# Altium footprint library LEMO THD_OLD.PcbLib: 54 footprints (part 3 of 4) (continued)
## LEMO_EZG.0B.302.CLN [mm] "Size 0B, Straight Receptacle with 2 Female Contacts and Alignment Key (G)"
height 15
pads (6):
  round 1.6 hole 0.9: 1(0,1.1) 2(0,-1.1)
  round 3.5 hole 1.8: 3(-3.81,-3.81) 3(-3.81,3.81) 3(3.81,-3.81) 3(3.81,3.81)
Top Overlay:
  lines w0.2: -5,-2.08 -5,2.08 ; -4.151,-1.738 cw(c0,0) -4.151,1.738 ; -3.239,-1.789 cw(c0,0) -3.239,1.789 ; -2.08,-5 2.08,-5 ; -2.08,5 2.08,5 ; -1.789,-3.239 ccw(c0,0) 1.789,-3.239 ; -1.789,3.239 cw(c0,0) -0.5,3.666 -0.5,4.05 0.5,4.05 0.5,3.666 cw(c0,0) 1.789,3.239 ; -1.738,-4.151 ccw(c0,0) 1.738,-4.151 ; -1.738,4.151 cw(c0,0) 1.738,4.151 ; -0.883,2.069 ccw(c0,0) -0.827,-2.093 ; 0.823,2.094 cw(c0,0) 1.103,-1.961 ; 3.239,-1.789 ccw(c0,0) 3.239,1.789 ; 4.151,-1.738 ccw(c0,0) 4.151,1.738 ; 5,-2.08 5,2.08
  text "1" at -0.162,2.293 h1
  text "2" at -0.299,-3.308 h1
Mechanical 8:
  lines w0.1: -4.31,-3.81 -3.81,-3.81 ; -4.31,3.81 -3.81,3.81 ; -3.81,-4.31 -3.81,-3.81 ; -3.81,-3.31 -3.81,-3.81 ; -3.81,3.31 -3.81,3.81 ; -3.81,4.31 -3.81,3.81 ; -3.31,-3.81 -3.81,-3.81 ; -3.31,3.81 -3.81,3.81 ; -0.5,-1.1 0,-1.1 ; -0.5,0 0,0 ; -0.5,1.1 0,1.1 ; 0,-1.6 0,-1.1 ; 0,-0.6 0,-1.1 ; 0,-0.5 0,0 ; 0,0.5 0,0 ; 0,0.6 0,1.1 ; 0,1.6 0,1.1 ; 0.5,-1.1 0,-1.1 ; 0.5,0 0,0 ; 0.5,1.1 0,1.1 ; 3.31,-3.81 3.81,-3.81 ; 3.31,3.81 3.81,3.81 ; 3.81,-4.31 3.81,-3.81 ; 3.81,-3.31 3.81,-3.81 ; 3.81,3.31 3.81,3.81 ; 3.81,4.31 3.81,3.81 ; 4.31,-3.81 3.81,-3.81 ; 4.31,3.81 3.81,3.81
Mechanical 14:
  circle w0.1: c0,1.1 r0.35
  circle w0.1: c0,-1.1 r0.35
  circle w0.1: c0,1.1 r0.55
  circle w0.1: c0,-1.1 r0.55
  circle w0.1: c0,0 r2.25
  circle w0.1: c0,0 r4.5
  lines w0.1: -5,-2.527 ccw(c-3.81,-3.81) -2.527,-5 ; -5,2.527 cw(c-3.81,3.81) -2.527,5 ; 2.527,-5 ccw(c3.81,-3.81) 5,-2.527 ; 2.527,5 cw(c3.81,3.81) 5,2.527 ; -5,-4.346 -5,4.346 -4.346,5 4.346,5 5,4.346 5,-4.346 4.346,-5 -4.346,-5 -5,-4.346 ; -0.5,3.666 ccw(c0,0) 0.5,3.666 0.5,4.05 -0.5,4.05 -0.5,3.666
  text "1" at -0.162,2.293 h1
  text "2" at -0.299,-3.308 h1
3D body "LEMO_EZG.0B.302.CLN_Part1.stp": height 15, standoff -4.5, extent -5,-5 5,5
3D body "LEMO_EZG.0B.302.CLN_Part2.stp": height 3.9, standoff -3.7, extent -5.56,-5.56 5.56,5.56

## LEMO_EZG.0S.302.NLNY [mm] "Serie 0S, 1 Female + 1 Male Contacts, Straight Socket With Key (G)"
height 15.8
pads (6):
  round 1.6 hole 0.9: 1(0,1.1) 2(0,-1.1) 3(-3.81,-3.81) 3(-3.81,3.81) 3(3.81,-3.81) 3(3.81,3.81)
Top Overlay:
  circle w0.2: c0,0 r4.1
  lines w0.2: -3.573,-2.736 cw(c0,0) -3.573,2.736 ; -2.736,-3.573 ccw(c0,0) 2.736,-3.573 ; -2.736,3.573 cw(c0,0) 2.736,3.573 ; 3.573,-2.736 ccw(c0,0) 3.573,2.736 ; -5,-4.293 -4.293,-5 4.293,-5 5,-4.293 5,4.293 4.293,5 -4.293,5 -5,4.293 -5,-4.293 ; -2.25,0 cw(c0,0) 2.25,0 -2.25,0 ; -0.6,3.551 ccw(c0,-0.1) 0.6,3.551 0.6,3.9 -0.6,3.9 -0.6,3.551
  text "2" at 1.326,-1.598 h1
  text "1" at 2.764,0.091 h1
Mechanical 8:
  circle w0.1: c-3.81,3.81 r1.2
  circle w0.1: c3.81,3.81 r1.2
  circle w0.1: c3.81,-3.81 r1.2
  circle w0.1: c-3.81,-3.81 r1.2
  lines w0.1: -4.31,-3.81 -3.81,-3.81 ; -4.31,3.81 -3.81,3.81 ; -3.81,-4.31 -3.81,-3.81 ; -3.81,-3.31 -3.81,-3.81 ; -3.81,3.31 -3.81,3.81 ; -3.81,4.31 -3.81,3.81 ; -3.31,-3.81 -3.81,-3.81 ; -3.31,3.81 -3.81,3.81 ; -0.5,-1.1 0,-1.1 ; -0.5,0 0,0 ; -0.5,1.1 0,1.1 ; 0,-1.6 0,-1.1 ; 0,-0.6 0,-1.1 ; 0,-0.5 0,0 ; 0,0.5 0,0 ; 0,0.6 0,1.1 ; 0,1.6 0,1.1 ; 0.5,-1.1 0,-1.1 ; 0.5,0 0,0 ; 0.5,1.1 0,1.1 ; 3.31,-3.81 3.81,-3.81 ; 3.31,3.81 3.81,3.81 ; 3.81,-4.31 3.81,-3.81 ; 3.81,-3.31 3.81,-3.81 ; 3.81,3.31 3.81,3.81 ; 3.81,4.31 3.81,3.81 ; 4.31,-3.81 3.81,-3.81 ; 4.31,3.81 3.81,3.81
Mechanical 14:
  circle w0.1: c0,0 r4.5
  circle w0.1: c0,0 r4.1
  circle w0.1: c0,1.1 r0.55
  circle w0.1: c0,-1.1 r0.5
  lines w0.1: -0.5,-1.1 0.5,-1.1 ; -0.49,-1.2 0.49,-1.2 ; -0.49,-1 0.49,-1 ; -0.458,-1.3 0.458,-1.3 ; -0.458,-0.9 0.458,-0.9 ; -0.4,-1.4 0.4,-1.4 ; -0.4,-0.8 0.4,-0.8 ; -0.3,-1.5 0.3,-1.5 ; -0.3,-0.7 0.3,-0.7 ; -5,-4.293 -4.293,-5 4.293,-5 5,-4.293 5,4.293 4.293,5 -4.293,5 -5,4.293 -5,-4.293 ; -2.25,0 cw(c0,0) 2.25,0 -2.25,0 ; -0.6,3.551 ccw(c0,-0.1) 0.6,3.551 0.6,3.9 -0.6,3.9 -0.6,3.551
  text "2" at 1.326,-1.598 h1
  text "1" at 2.764,0.091 h1
3D body "LEMO_EZG.0S.302.NLNY.stp": height 15.8, standoff -4, extent -5.01,-5.004 5.004,5.002

## LEMO_EZG.1B.302.CLN [mm] "Size 1B, Straight Socket with 2 Female Contacts and Alignment Key (G)"
height 19
pads (6):
  round 1.6 hole 0.9: 1(0,1.4) 2(0,-1.4)
  round 2.5 / inner round 2.5 / far side round 3.7 hole 1.8: 3(-3.81,-3.81) 3(-3.81,3.81) 3(3.81,-3.81) 3(3.81,3.81)
Top Layer:
  region: -2.55,-2.55 -6.2,-2.55 -6.2,-5.374 -5.374,-6.2 -2.55,-6.2
  region: 2.55,-2.55 2.55,-6.2 5.374,-6.2 6.2,-5.374 6.2,-2.55
  region: 2.55,2.55 6.2,2.55 6.2,5.374 5.374,6.2 2.55,6.2
  region: -2.55,2.55 -2.55,6.2 -5.374,6.2 -6.2,5.374 -6.2,2.55
Top Overlay:
  lines w0.2: -6,-2.2 -6,2.2 ; -5.147,-1.939 cw(c0,0) -5.147,1.939 ; -4.422,-1.593 cw(c0,0) -4.422,1.593 ; -2.2,-6 2.2,-6 ; -2.2,6 2.2,6 ; -1.939,-5.147 ccw(c0,0) 1.939,-5.147 ; -1.939,5.147 cw(c0,0) 1.939,5.147 ; -1.593,-4.422 ccw(c0,0) 1.593,-4.422 ; -1.593,4.422 cw(c0,0) -0.6,4.662 -0.6,5.065 cw(c0,0) 0.6,5.065 0.6,4.662 cw(c0,0) 1.593,4.422 ; 4.422,-1.593 ccw(c0,0) 4.422,1.593 ; 5.147,-1.939 ccw(c0,0) 5.147,1.939 ; 6,-2.2 6,2.2 6,-2.2
  text "2" at -0.318,-3.786 h1
  text "1" at -0.159,2.722 h1
Mechanical 8:
  circle w0.05: c-3.81,-3.81 r0.45
  circle w0.05: c-3.81,-3.81 r0.8
  circle w0.05: c3.81,-3.81 r0.45
  circle w0.05: c3.81,-3.81 r0.8
  circle w0.05: c3.81,3.81 r0.45
  circle w0.05: c3.81,3.81 r0.8
  circle w0.05: c-3.81,3.81 r0.45
  circle w0.05: c-3.81,3.81 r0.8
  circle w0.05: c-3.81,-3.81 r1.75
  circle w0.05: c3.81,-3.81 r1.75
  circle w0.05: c3.81,3.81 r1.75
  circle w0.05: c-3.81,3.81 r1.75
  lines w0.05: -4.729,-4.729 -4.375,-4.375 ; -4.729,-4.021 -4.375,-4.375 ; -4.729,4.021 -4.375,4.375 ; -4.729,4.729 -4.375,4.375 ; -4.31,-3.81 -3.81,-3.81 ; -4.31,3.81 -3.81,3.81 ; -4.021,-4.729 -4.375,-4.375 ; -4.021,-4.021 -4.375,-4.375 ; -4.021,4.021 -4.375,4.375 ; -4.021,4.729 -4.375,4.375 ; -3.81,-4.31 -3.81,-3.81 ; -3.81,-3.31 -3.81,-3.81 ; -3.81,3.31 -3.81,3.81 ; -3.81,4.31 -3.81,3.81 ; -3.31,-3.81 -3.81,-3.81 ; -3.31,3.81 -3.81,3.81 ; -0.5,-1.4 0,-1.4 ; -0.5,0 0,0 ; -0.5,1.4 0,1.4 ; 0,-1.9 0,-1.4 ; 0,-0.9 0,-1.4 ; 0,-0.5 0,0 ; 0,0.5 0,0 ; 0,0.9 0,1.4 ; 0,1.9 0,1.4 ; 0.5,-1.4 0,-1.4 ; 0.5,0 0,0 ; 0.5,1.4 0,1.4 ; 3.31,-3.81 3.81,-3.81 ; 3.31,3.81 3.81,3.81 ; 3.81,-4.31 3.81,-3.81 ; 3.81,-3.31 3.81,-3.81 ; 3.81,3.31 3.81,3.81 ; 3.81,4.31 3.81,3.81 ; 4.021,-4.729 4.375,-4.375 ; 4.021,-4.021 4.375,-4.375 ; 4.021,4.021 4.375,4.375 ; 4.021,4.729 4.375,4.375 ; 4.31,-3.81 3.81,-3.81 ; 4.31,3.81 3.81,3.81 ; 4.729,-4.729 4.375,-4.375 ; 4.729,-4.021 4.375,-4.375 ; 4.729,4.021 4.375,4.375 ; 4.729,4.729 4.375,4.375 ; -6.2,-5.374 -6.2,-2.55 -2.55,-2.55 -2.55,-6.2 -5.374,-6.2 -6.2,-5.374 ; -6.2,2.55 -6.2,5.374 -5.374,6.2 -2.55,6.2 -2.55,2.55 -6.2,2.55 ; -6,-5.292 -6,-2.75 -2.75,-2.75 -2.75,-6 -5.292,-6 -6,-5.292 ; -6,2.75 -6,5.292 -5.292,6 -2.75,6 -2.75,2.75 -6,2.75 ; 2.55,-6.2 5.374,-6.2 6.2,-5.374 6.2,-2.55 2.55,-2.55 2.55,-6.2 ; 2.55,2.55 6.2,2.55 6.2,5.374 5.374,6.2 2.55,6.2 2.55,2.55 ; 2.75,-6 5.292,-6 6,-5.292 6,-2.75 2.75,-2.75 2.75,-6 ; 2.75,2.75 6,2.75 6,5.292 5.292,6 2.75,6 2.75,2.75
Mechanical 14:
  circle w0.1: c0,-1.4 r0.5
  circle w0.1: c0,0 r5.5
  circle w0.1: c0,1.4 r0.5
  circle w0.1: c0,0 r3
  lines w0.1: 6,-5.292 6,5.292 ; 6,-5.292 5.292,-6 -5.292,-6 -6,-5.292 -6,5.292 -5.292,6 5.292,6 6,5.292 ; 6,-5.292 6,5.292 ; -0.6,4.662 ccw(c0,0) 0.6,4.662 0.6,5.065 ccw(c0,0) -0.6,5.065 -0.6,4.662
  text "2" at -0.318,-3.786 h1
  text "1" at -0.159,2.722 h1
3D body "LEMO_EZG.1B.304.NLN_Part2.stp": height 3.9, standoff -3.2, extent -5.56,-5.56 5.56,5.56
3D body "LEMO_EZG.1B.302.CLN.stp": height 19, standoff -3.8, extent -6,-6 6,6

## LEMO_EZG.1B.304.NLN [mm] "Size 1B, Straight Socket with 4 Female Contacts and Alignment Key (G)"
height 19
pads (8):
  round 1.6 hole 0.9: 1(-1.096,1.096) 2(-1.096,-1.096) 3(1.096,-1.096) 4(1.096,1.096)
  round 2.5 / inner round 2.5 / far side round 3.7 hole 1.8: 5(-3.81,-3.81) 5(-3.81,3.81) 5(3.81,-3.81) 5(3.81,3.81)
Top Layer:
  region: -2.55,2.55 -2.55,6.2 -5.374,6.2 -6.2,5.374 -6.2,2.55
  region: 2.55,2.55 6.2,2.55 6.2,5.374 5.374,6.2 2.55,6.2
  region: 2.55,-2.55 2.55,-6.2 5.374,-6.2 6.2,-5.374 6.2,-2.55
  region: -2.55,-2.55 -6.2,-2.55 -6.2,-5.374 -5.374,-6.2 -2.55,-6.2
Top Overlay:
  lines w0.2: -6,-2.2 -6,2.2 ; -5.147,-1.939 cw(c0,0) -5.147,1.939 ; -4.422,-1.593 cw(c0,0) -4.422,1.593 ; -2.2,-6 2.2,-6 ; -2.2,6 2.2,6 ; -1.939,-5.147 ccw(c0,0) 1.939,-5.147 ; -1.939,5.147 cw(c0,0) 1.939,5.147 ; -1.593,-4.422 ccw(c0,0) 1.593,-4.422 ; -1.593,4.422 cw(c0,0) -0.6,4.662 -0.6,5.065 cw(c0,0) 0.6,5.065 0.6,4.662 cw(c0,0) 1.593,4.422 ; 4.422,-1.593 ccw(c0,0) 4.422,1.593 ; 5.147,-1.939 ccw(c0,0) 5.147,1.939 ; 6,-2.2 6,2.2 6,-2.2
  text "1" at -3.81,0.5 h1
  text "2" at -3.969,-1.429 h1
  text "3" at 3.493,-1.429 h1
  text "4" at 3.493,0.5 h1
Mechanical 8:
  circle w0.05: c-3.81,3.81 r1.75
  circle w0.05: c3.81,3.81 r1.75
  circle w0.05: c3.81,-3.81 r1.75
  circle w0.05: c-3.81,-3.81 r1.75
  circle w0.05: c-3.81,3.81 r0.8
  circle w0.05: c-3.81,3.81 r0.45
  circle w0.05: c3.81,3.81 r0.8
  circle w0.05: c3.81,3.81 r0.45
  circle w0.05: c3.81,-3.81 r0.8
  circle w0.05: c3.81,-3.81 r0.45
  circle w0.05: c-3.81,-3.81 r0.8
  circle w0.05: c-3.81,-3.81 r0.45
  lines w0.05: -4.729,-4.729 -4.375,-4.375 ; -4.729,-4.021 -4.375,-4.375 ; -4.729,4.021 -4.375,4.375 ; -4.729,4.729 -4.375,4.375 ; -4.31,-3.81 -3.81,-3.81 ; -4.31,3.81 -3.81,3.81 ; -4.021,-4.729 -4.375,-4.375 ; -4.021,-4.021 -4.375,-4.375 ; -4.021,4.021 -4.375,4.375 ; -4.021,4.729 -4.375,4.375 ; -3.81,-4.31 -3.81,-3.81 ; -3.81,-3.31 -3.81,-3.81 ; -3.81,3.31 -3.81,3.81 ; -3.81,4.31 -3.81,3.81 ; -3.31,-3.81 -3.81,-3.81 ; -3.31,3.81 -3.81,3.81 ; -1.596,-1.096 -1.096,-1.096 ; -1.596,1.096 -1.096,1.096 ; -1.096,-1.596 -1.096,-1.096 ; -1.096,-0.596 -1.096,-1.096 ; -1.096,0.596 -1.096,1.096 ; -1.096,1.596 -1.096,1.096 ; -0.596,-1.096 -1.096,-1.096 ; -0.596,1.096 -1.096,1.096 ; -0.5,0 0,0 ; 0,-0.5 0,0 ; 0,0.5 0,0 ; 0.5,0 0,0 ; 0.596,-1.096 1.096,-1.096 ; 0.596,1.096 1.096,1.096 ; 1.096,-1.596 1.096,-1.096 ; 1.096,-0.596 1.096,-1.096 ; 1.096,0.596 1.096,1.096 ; 1.096,1.596 1.096,1.096 ; 1.596,-1.096 1.096,-1.096 ; 1.596,1.096 1.096,1.096 ; 3.31,-3.81 3.81,-3.81 ; 3.31,3.81 3.81,3.81 ; 3.81,-4.31 3.81,-3.81 ; 3.81,-3.31 3.81,-3.81 ; 3.81,3.31 3.81,3.81 ; 3.81,4.31 3.81,3.81 ; 4.021,-4.729 4.375,-4.375 ; 4.021,-4.021 4.375,-4.375 ; 4.021,4.021 4.375,4.375 ; 4.021,4.729 4.375,4.375 ; 4.31,-3.81 3.81,-3.81 ; 4.31,3.81 3.81,3.81 ; 4.729,-4.729 4.375,-4.375 ; 4.729,-4.021 4.375,-4.375 ; 4.729,4.021 4.375,4.375 ; 4.729,4.729 4.375,4.375 ; -6.2,-5.374 -5.374,-6.2 -2.55,-6.2 -2.55,-2.55 -6.2,-2.55 -6.2,-5.374 ; -6.2,2.55 -2.55,2.55 -2.55,6.2 -5.374,6.2 -6.2,5.374 -6.2,2.55 ; -6,-5.292 -5.292,-6 -2.75,-6 -2.75,-2.75 -6,-2.75 -6,-5.292 ; -6,2.75 -2.75,2.75 -2.75,6 -5.292,6 -6,5.292 -6,2.75 ; 2.55,-6.2 2.55,-2.55 6.2,-2.55 6.2,-5.374 5.374,-6.2 2.55,-6.2 ; 2.55,2.55 2.55,6.2 5.374,6.2 6.2,5.374 6.2,2.55 2.55,2.55 ; 2.75,-6 2.75,-2.75 6,-2.75 6,-5.292 5.292,-6 2.75,-6 ; 2.75,2.75 2.75,6 5.292,6 6,5.292 6,2.75 2.75,2.75
Mechanical 14:
  circle w0.1: c0,0 r3
  circle w0.1: c-1.096,1.096 r0.5
  circle w0.1: c0,0 r5.5
  circle w0.1: c-1.096,-1.096 r0.5
  circle w0.1: c1.096,-1.096 r0.5
  circle w0.1: c1.096,1.096 r0.5
  lines w0.1: 6,-5.292 6,5.292 ; 6,-5.292 5.292,-6 -5.292,-6 -6,-5.292 -6,5.292 -5.292,6 5.292,6 6,5.292 ; 6,-5.292 6,5.292 ; -0.6,4.662 ccw(c0,0) 0.6,4.662 0.6,5.065 ccw(c0,0) -0.6,5.065 -0.6,4.662
  text "1" at -3.81,0.5 h1
  text "2" at -3.969,-1.429 h1
  text "3" at 3.493,-1.429 h1
  text "4" at 3.492,0.5 h1
3D body "LEMO_EZG.1B.304.NLN_Part1.stp": height 19, standoff -3.8, extent -6,-6 6,6
3D body "LEMO_EZG.1B.304.NLN_Part2.stp": height 3.9, standoff -3.2, extent -5.56,-5.56 5.56,5.56

## LEMO_EZG.1B.306.CLN [mm] "Size 1B, Straight Socket with 6 Female Contacts and Alignment Key (G)"
height 19
pads (10):
  round 1.5 hole 0.9: 1(-0.925,1.602) 2(-1.85,0) 3(-0.925,-1.602) 4(0.925,-1.602) 5(1.85,0) 6(0.925,1.602)
  round 2.4 / inner round 2.4 / far side round 3.7 hole 1.8: 7(-3.81,-3.81) 7(-3.81,3.81) 7(3.81,-3.81) 7(3.81,3.81)
Top Layer:
  region: -2.55,2.55 -2.55,6.2 -5.374,6.2 -6.2,5.374 -6.2,2.55
  region: 2.55,2.55 6.2,2.55 6.2,5.374 5.374,6.2 2.55,6.2
  region: 2.55,-2.55 2.55,-6.2 5.374,-6.2 6.2,-5.374 6.2,-2.55
  region: -2.55,-2.55 -6.2,-2.55 -6.2,-5.374 -5.374,-6.2 -2.55,-6.2
Top Overlay:
  lines w0.2: -6,-2.2 -6,2.2 ; -5.147,-1.939 cw(c0,0) -5.147,1.939 ; -4.422,-1.593 cw(c0,0) -4.422,1.593 ; -2.2,-6 2.2,-6 ; -2.2,6 2.2,6 ; -1.939,-5.147 ccw(c0,0) 1.939,-5.147 ; -1.939,5.147 cw(c0,0) 1.939,5.147 ; -1.593,-4.422 ccw(c0,0) 1.593,-4.422 ; -1.593,4.422 cw(c0,0) -0.6,4.662 -0.6,5.065 cw(c0,0) 0.6,5.065 0.6,4.662 cw(c0,0) 1.593,4.422 ; 4.422,-1.593 ccw(c0,0) 4.422,1.593 ; 5.147,-1.939 ccw(c0,0) 5.147,1.939 ; 6,-2.2 6,2.2 6,-2.2
  text "1" at -1.212,2.933 h1.2
  text "2" at -4.012,-0.642 h1.2
  text "5" at 3.238,-0.492 h1.2
  text "3" at -0.862,-4.092 h1.2
Mechanical 8:
  circle w0.1: c-3.81,-3.81 r0.45
  circle w0.1: c-3.81,-3.81 r0.8
  circle w0.1: c3.81,-3.81 r0.45
  circle w0.1: c3.81,-3.81 r0.8
  circle w0.1: c3.81,3.81 r0.45
  circle w0.1: c3.81,3.81 r0.8
  circle w0.1: c-3.81,3.81 r0.45
  circle w0.1: c-3.81,3.81 r0.8
  circle w0.1: c-3.81,-3.81 r1.75
  circle w0.1: c3.81,-3.81 r1.75
  circle w0.1: c3.81,3.81 r1.75
  circle w0.1: c-3.81,3.81 r1.75
  lines w0.1: -4.729,-4.729 -4.375,-4.375 ; -4.729,-4.021 -4.375,-4.375 ; -4.729,4.021 -4.375,4.375 ; -4.729,4.729 -4.375,4.375 ; -4.31,-3.81 -3.81,-3.81 ; -4.31,3.81 -3.81,3.81 ; -4.021,-4.729 -4.375,-4.375 ; -4.021,-4.021 -4.375,-4.375 ; -4.021,4.021 -4.375,4.375 ; -4.021,4.729 -4.375,4.375 ; -3.81,-4.31 -3.81,-3.81 ; -3.81,-3.31 -3.81,-3.81 ; -3.81,3.31 -3.81,3.81 ; -3.81,4.31 -3.81,3.81 ; -3.31,-3.81 -3.81,-3.81 ; -3.31,3.81 -3.81,3.81 ; -2.35,0 -1.85,0 ; -1.85,-0.5 -1.85,0 ; -1.85,0.5 -1.85,0 ; -1.425,-1.602 -0.925,-1.602 ; -1.425,1.602 -0.925,1.602 ; -1.35,0 -1.85,0 ; -0.925,-2.102 -0.925,-1.602 ; -0.925,-1.102 -0.925,-1.602 ; -0.925,1.102 -0.925,1.602 ; -0.925,2.102 -0.925,1.602 ; -0.5,0 0,0 ; -0.425,-1.602 -0.925,-1.602 ; -0.425,1.602 -0.925,1.602 ; 0,-0.5 0,0 ; 0,0.5 0,0 ; 0.425,-1.602 0.925,-1.602 ; 0.425,1.602 0.925,1.602 ; 0.5,0 0,0 ; 0.925,-2.102 0.925,-1.602 ; 0.925,-1.102 0.925,-1.602 ; 0.925,1.102 0.925,1.602 ; 0.925,2.102 0.925,1.602 ; 1.35,0 1.85,0 ; 1.425,-1.602 0.925,-1.602 ; 1.425,1.602 0.925,1.602 ; 1.85,-0.5 1.85,0 ; 1.85,0.5 1.85,0 ; 2.35,0 1.85,0 ; 3.31,-3.81 3.81,-3.81 ; 3.31,3.81 3.81,3.81 ; 3.81,-4.31 3.81,-3.81 ; 3.81,-3.31 3.81,-3.81 ; 3.81,3.31 3.81,3.81 ; 3.81,4.31 3.81,3.81 ; 4.021,-4.729 4.375,-4.375 ; 4.021,-4.021 4.375,-4.375 ; 4.021,4.021 4.375,4.375 ; 4.021,4.729 4.375,4.375 ; 4.31,-3.81 3.81,-3.81 ; 4.31,3.81 3.81,3.81 ; 4.729,-4.729 4.375,-4.375 ; 4.729,-4.021 4.375,-4.375 ; 4.729,4.021 4.375,4.375 ; 4.729,4.729 4.375,4.375 ; -6.2,-5.374 -6.2,-2.55 -2.55,-2.55 -2.55,-6.2 -5.374,-6.2 -6.2,-5.374 ; -6.2,2.55 -6.2,5.374 -5.374,6.2 -2.55,6.2 -2.55,2.55 -6.2,2.55 ; -6,-5.292 -6,-2.75 -2.75,-2.75 -2.75,-6 -5.291,-6 -6,-5.292 ; -6,2.75 -6,5.292 -5.291,6 -2.75,6 -2.75,2.75 -6,2.75 ; 2.55,-6.2 5.374,-6.2 6.2,-5.374 6.2,-2.55 2.55,-2.55 2.55,-6.2 ; 2.55,2.55 6.2,2.55 6.2,5.374 5.374,6.2 2.55,6.2 2.55,2.55 ; 2.75,-6 5.292,-6 6,-5.292 6,-2.75 2.75,-2.75 2.75,-6 ; 2.75,2.75 6,2.75 6,5.292 5.292,6 2.75,6 2.75,2.75
Mechanical 14:
  circle w0.1: c0,0 r5.5
  circle w0.1: c0.925,1.602 r0.5
  circle w0.1: c1.85,0 r0.5
  circle w0.1: c0.925,-1.602 r0.5
  circle w0.1: c-0.925,-1.602 r0.5
  circle w0.1: c-1.85,0 r0.5
  circle w0.1: c-0.925,1.602 r0.5
  circle w0.1: c0,0 r3
  lines w0.1: 6,-5.292 6,5.292 ; 6,-5.292 5.292,-6 -5.291,-6 -6,-5.292 -6,5.292 -5.291,6 5.292,6 6,5.292 ; 6,-5.292 6,5.292 ; -0.6,4.662 ccw(c0,0) 0.6,4.662 0.6,5.065 ccw(c0,0) -0.6,5.065 -0.6,4.662
  text "1" at -1.212,2.933 h1.2
  text "2" at -4.012,-0.642 h1.2
  text "5" at 3.238,-0.492 h1.2
  text "3" at -0.862,-4.092 h1.2
3D body "LEMO_EZG.1B.306.CLN_Part2.stp": height 3.9, standoff -3.2, extent -5.559,-5.559 5.559,5.559
3D body "LEMO_EZG.1B.306.CLN_Part1.stp": height 19, standoff -3.8, extent -6,-6 6,6

## LEMO_HEN.2M.308.XLNP [mm] "Size 2M, 8 Contacts Circular Watertight (IP 68) Receptacle, with Fixing Nut"
height 16.8
pads (12):
  round 1.3 hole 0.8: 1(0,3.2) 2(-2.263,2.286) 3(-3.2,0) 4(-2.263,-2.263) 5(0,-3.2) 6(2.286,-2.263) 7(3.2,0) 8(2.286,2.286)
  rect 1.7x1.7 hole 1: 9(-4.445,4.445) 10(-4.445,-4.445) 11(4.445,-4.445) 12(4.445,4.445)
Top Overlay:
  circle w0.2: c0,3.2 r1
  circle w0.2: c0,0 r10.5
  lines w0.2: -9,-5.408 -9,5.408 ; -9,-2.048 ccw(c0,0) 9,-2.048 ; -9,2.048 cw(c0,0) 9,2.048 ; -5.645,-5.237 cw(c0,0) -5.645,5.237 ; -5.237,-5.645 ccw(c0,0) 5.237,-5.645 ; -5.237,5.645 cw(c0,0) 5.237,5.645 ; -5.12,-3.195 cw(c0,0) -5.12,3.195 ; -3.195,-5.12 ccw(c0,0) -2.284,-5.586 -2.42,-6.096 -0.952,-6.49 -0.815,-5.98 ccw(c0,0) 0.815,-5.98 0.952,-6.49 2.42,-6.096 2.284,-5.586 ccw(c0,0) 3.195,-5.12 ; -3.195,5.12 cw(c0,0) -1.01,5.95 -1.01,6.515 1.01,6.515 1.01,5.95 cw(c0,0) 3.195,5.12 ; -2.821,0.925 -2.642,1.361 ; -2.817,-0.924 -2.645,-1.339 ; -1.339,-2.645 -0.924,-2.817 ; -1.336,2.661 -0.927,2.826 ; 0.925,-2.821 1.361,-2.642 ; 2.657,1.358 2.829,0.928 ; 2.661,-1.336 2.826,-0.927 ; 5.12,-3.195 ccw(c0,0) 5.12,3.195 ; 5.645,-5.237 ccw(c0,0) 5.645,5.237 ; 9,-5.408 9,5.408
  text "1" at -0.117,4.695 h1.2
Mechanical 2:
  text "BLUE" at -1.586,7.873 h1
Mechanical 8:
  lines w0.1: -4.945,-4.445 -4.445,-4.445 ; -4.945,4.445 -4.445,4.445 ; -4.445,-4.945 -4.445,-4.445 ; -4.445,-3.945 -4.445,-4.445 ; -4.445,3.945 -4.445,4.445 ; -4.445,4.945 -4.445,4.445 ; -3.945,-4.445 -4.445,-4.445 ; -3.945,4.445 -4.445,4.445 ; -3.7,0 -3.2,0 ; -3.2,-0.5 -3.2,0 ; -3.2,0.5 -3.2,0 ; -2.763,-2.263 -2.263,-2.263 ; -2.763,2.286 -2.263,2.286 ; -2.7,0 -3.2,0 ; -2.263,-2.763 -2.263,-2.263 ; -2.263,-1.763 -2.263,-2.263 ; -2.263,1.786 -2.263,2.286 ; -2.263,2.786 -2.263,2.286 ; -2.16,-5.33 -1.294,-4.83 -1.794,-3.964 ; -2.113,-4.532 ccw(c0,0) 2.113,-4.532 ; -1.763,-2.263 -2.263,-2.263 ; -1.763,2.286 -2.263,2.286 ; -1.686,-6.293 0,0 ; -0.5,-3.2 0,-3.2 ; -0.5,3.2 0,3.2 ; 0,-3.7 0,-3.2 ; 0,-2.7 0,-3.2 ; 0,2.7 0,3.2 ; 0,3.7 0,3.2 ; 0,6.515 0,0 ; 0.5,-3.2 0,-3.2 ; 0.5,3.2 0,3.2 ; 1.686,-6.293 0,0 ; 1.786,-2.263 2.286,-2.263 ; 1.786,2.286 2.286,2.286 ; 1.794,-3.964 1.294,-4.83 2.16,-5.33 ; 2.286,-2.763 2.286,-2.263 ; 2.286,-1.763 2.286,-2.263 ; 2.286,1.786 2.286,2.286 ; 2.286,2.786 2.286,2.286 ; 2.7,0 3.2,0 ; 2.786,-2.263 2.286,-2.263 ; 2.786,2.286 2.286,2.286 ; 3.2,-0.5 3.2,0 ; 3.2,0.5 3.2,0 ; 3.7,0 3.2,0 ; 3.945,-4.445 4.445,-4.445 ; 3.945,4.445 4.445,4.445 ; 4.445,-4.945 4.445,-4.445 ; 4.445,-3.945 4.445,-4.445 ; 4.445,3.945 4.445,4.445 ; 4.445,4.945 4.445,4.445 ; 4.945,-4.445 4.445,-4.445 ; 4.945,4.445 4.445,4.445
  text "30" at -0.595,-4.879 h1
Mechanical 14:
  circle w0.1: c2.286,2.286 r0.55
  circle w0.1: c3.2,0 r0.55
  circle w0.1: c2.286,-2.263 r0.55
  circle w0.1: c0,-3.2 r0.55
  circle w0.1: c-2.263,-2.263 r0.55
  circle w0.1: c-3.2,0 r0.55
  circle w0.1: c-2.263,2.286 r0.55
  circle w0.1: c0,3.2 r1
  circle w0.1: c0,0 r7.7
  circle w0.1: c0,0 r10.5
  lines w0.1: -9,-5.408 -9,5.408 ; -9,-2.048 ccw(c0,0) 9,-2.048 ; -9,2.048 cw(c0,0) 9,2.048 ; -2.991,0.509 -2.471,1.777 ; -2.989,-0.508 -2.473,-1.755 ; -1.755,-2.473 -0.508,-2.99 ; -1.753,2.492 -0.927,2.826 ; 0.509,-2.991 1.777,-2.471 ; 2.49,1.775 2.996,0.511 ; 2.492,-1.753 2.994,-0.51 ; 9,-5.408 9,5.408 ; -2.42,-6.096 -0.952,-6.49 -0.815,-5.98 ccw(c0,0) 0.815,-5.98 0.952,-6.49 2.42,-6.096 2.284,-5.586 ccw(c0,0) 1.01,5.95 1.01,6.515 -1.01,6.515 -1.01,5.95 ccw(c0,0) -2.284,-5.586 -2.42,-6.096
  text "1" at -0.117,4.695 h1.2
3D body "LEMO_HEN.2M.308.XLNP_Part1.stp": height 16.8, standoff -4, extent -10.4,-10.4 10.4,10.4
3D body "LEMO_HEN.2M.308.XLNP_Part2.stp": height 11.5, standoff 8.3, extent -10.5,-10.5 10.5,10.5

## LEMO_HEN.2M.312.XLNP [mm] "Size 2M, 12 Contacts Circular Watertight (IP 68) Receptacle, with Fixing Nut"
height 16.8
pads (16):
  round 1.3 hole 0.8: 1(-1.244,3.023) 2(-3.003,1.245) 3(-3.003,-1.244) 4(-1.244,-3.003) 5(1.245,-3.003) 6(3.023,-1.244) 7(3.023,1.245) 8(1.245,3.023) 9(-0.99,0.991) 10(-0.99,-0.99) 11(0.991,-0.99) 12(0.991,0.991)
  rect 1.7x1.7 hole 1: 13(-4.445,4.445) 14(-4.445,-4.445) 15(4.445,-4.445) 16(4.445,4.445)
Top Overlay:
  circle w0.2: c0,0 r10.5
  circle w0.2: c-1.244,3.023 r1
  lines w0.2: -9,-5.408 -9,5.408 ; -9,-2.048 ccw(c0,0) 9,-2.048 ; -9,2.048 cw(c0,0) 9,2.048 ; -5.645,-5.237 cw(c0,0) -5.645,5.237 ; -5.237,-5.645 ccw(c0,0) 5.237,-5.645 ; -5.237,5.645 cw(c0,0) 5.237,5.645 ; -5.12,-3.195 cw(c0,0) -5.12,3.195 ; -3.195,-5.12 ccw(c0,0) -2.284,-5.586 -2.42,-6.096 -0.952,-6.49 -0.815,-5.98 ccw(c0,0) 0.815,-5.98 0.952,-6.49 2.42,-6.096 2.284,-5.586 ccw(c0,0) 3.195,-5.12 ; -3.195,5.12 cw(c0,0) -1.01,5.95 -1.01,6.515 1.01,6.515 1.01,5.95 cw(c0,0) 3.195,5.12 ; -3.003,-0.244 -3.003,0.245 ; -2.299,1.956 -1.947,2.312 ; -2.296,-1.951 -1.951,-2.296 ; -0.25,1.663 0.505,2.35 ; -0.244,-3.003 0.245,-3.003 ; 1.952,2.315 2.315,1.952 ; 1.956,-2.299 2.312,-1.947 ; 3.023,-0.244 3.023,0.245 ; 5.12,-3.195 ccw(c0,0) 5.12,3.195 ; 5.645,-5.237 ccw(c0,0) 5.645,5.237 ; 9,-5.408 9,5.408
  text "1" at -0.117,4.695 h1.2
Mechanical 2:
  text "BLUE" at -1.586,7.873 h1
Mechanical 8:
  lines w0.1: -4.945,-4.445 -4.445,-4.445 ; -4.945,4.445 -4.445,4.445 ; -4.445,-4.945 -4.445,-4.445 ; -4.445,-3.945 -4.445,-4.445 ; -4.445,3.945 -4.445,4.445 ; -4.445,4.945 -4.445,4.445 ; -3.945,-4.445 -4.445,-4.445 ; -3.945,4.445 -4.445,4.445 ; -3.503,-1.244 -3.003,-1.244 ; -3.503,1.245 -3.003,1.245 ; -3.003,-1.744 -3.003,-1.244 ; -3.003,-0.744 -3.003,-1.244 ; -3.003,0.745 -3.003,1.245 ; -3.003,1.745 -3.003,1.245 ; -2.503,-1.244 -3.003,-1.244 ; -2.503,1.245 -3.003,1.245 ; -2.16,-5.33 -1.294,-4.83 -1.794,-3.964 ; -2.113,-4.531 ccw(c0,0) 2.113,-4.531 ; -1.744,-3.003 -1.244,-3.003 ; -1.744,3.023 -1.244,3.023 ; -1.686,-6.293 0,0 ; -1.49,-0.99 -0.99,-0.99 ; -1.49,0.991 -0.99,0.991 ; -1.244,-3.503 -1.244,-3.003 ; -1.244,-2.503 -1.244,-3.003 ; -1.244,2.523 -1.244,3.023 ; -1.244,3.523 -1.244,3.023 ; -0.99,-1.49 -0.99,-0.99 ; -0.99,-0.49 -0.99,-0.99 ; -0.99,0.491 -0.99,0.991 ; -0.99,1.491 -0.99,0.991 ; -0.744,-3.003 -1.244,-3.003 ; -0.744,3.023 -1.244,3.023 ; -0.49,-0.99 -0.99,-0.99 ; -0.49,0.991 -0.99,0.991 ; 0,6.515 0,0 ; 0.491,-0.99 0.991,-0.99 ; 0.491,0.991 0.991,0.991 ; 0.745,-3.003 1.245,-3.003 ; 0.745,3.023 1.245,3.023 ; 0.991,-1.49 0.991,-0.99 ; 0.991,-0.49 0.991,-0.99 ; 0.991,0.491 0.991,0.991 ; 0.991,1.491 0.991,0.991 ; 1.245,-3.503 1.245,-3.003 ; 1.245,-2.503 1.245,-3.003 ; 1.245,2.523 1.245,3.023 ; 1.245,3.523 1.245,3.023 ; 1.491,-0.99 0.991,-0.99 ; 1.491,0.991 0.991,0.991 ; 1.686,-6.293 0,0 ; 1.745,-3.003 1.245,-3.003 ; 1.745,3.023 1.245,3.023 ; 1.794,-3.964 1.294,-4.83 2.16,-5.33 ; 2.523,-1.244 3.023,-1.244 ; 2.523,1.245 3.023,1.245 ; 3.023,-1.744 3.023,-1.244 ; 3.023,-0.744 3.023,-1.244 ; 3.023,0.745 3.023,1.245 ; 3.023,1.745 3.023,1.245 ; 3.523,-1.244 3.023,-1.244 ; 3.523,1.245 3.023,1.245 ; 3.945,-4.445 4.445,-4.445 ; 3.945,4.445 4.445,4.445 ; 4.445,-4.945 4.445,-4.445 ; 4.445,-3.945 4.445,-4.445 ; 4.445,3.945 4.445,4.445 ; 4.445,4.945 4.445,4.445 ; 4.945,-4.445 4.445,-4.445 ; 4.945,4.445 4.445,4.445
  text "30" at -0.595,-4.879 h1
Mechanical 14:
  circle w0.1: c-1.244,3.023 r0.55
  circle w0.1: c1.245,3.023 r0.55
  circle w0.1: c3.023,1.245 r0.55
  circle w0.1: c0.991,0.991 r0.55
  circle w0.1: c3.023,-1.244 r0.55
  circle w0.1: c0.991,-0.99 r0.55
  circle w0.1: c-0.99,-0.99 r0.55
  circle w0.1: c-0.99,0.991 r0.55
  circle w0.1: c-3.003,1.245 r0.55
  circle w0.1: c-3.003,-1.244 r0.55
  circle w0.1: c-1.244,-3.003 r0.55
  circle w0.1: c1.245,-3.003 r0.55
  circle w0.1: c-1.244,3.023 r1
  circle w0.1: c0,0 r7.7
  circle w0.1: c0,0 r10.5
  lines w0.1: -9,-5.408 -9,5.408 ; -9,-2.048 ccw(c0,0) 9,-2.048 ; -9,2.048 cw(c0,0) 9,2.048 ; -3.003,-0.694 -3.003,0.695 ; -2.616,1.636 -1.947,2.312 ; -2.614,-1.633 -1.633,-2.614 ; -0.99,-0.44 -0.99,0.441 ; -0.694,-3.003 0.695,-3.003 ; -0.583,1.361 0.838,2.653 ; -0.44,-0.99 0.441,-0.99 ; 0.991,-0.44 0.991,0.441 ; 1.634,2.634 2.634,1.634 ; 1.636,-2.616 2.632,-1.631 ; 3.023,-0.694 3.023,0.695 ; 9,-5.408 9,5.408 ; -2.42,-6.096 -0.952,-6.49 -0.815,-5.98 ccw(c0,0) 0.815,-5.98 0.952,-6.49 2.42,-6.096 2.284,-5.586 ccw(c0,0) 1.01,5.95 1.01,6.515 -1.01,6.515 -1.01,5.95 ccw(c0,0) -2.284,-5.586 -2.42,-6.096
  text "1" at -0.117,4.695 h1.2
3D body "LEMO_HEN.2M.312.XLNP_Part1.stp": height 16.8, standoff -4, extent -10.4,-10.4 10.4,10.4
3D body "LEMO_HEN.2M.312.XLNP_Part2.stp": height 11.5, standoff 8.3, extent -10.5,-10.5 10.5,10.5